# Altium footprint library DIOT_temperature_logger.PcbLib: 100 footprints (part 1 of 7)
Each footprint in its own frame and in the unit in brackets; x right, y up, seen from the top. Pads: shape width x height; smd on the part's side, far side on the other; paste and mask are expansions set on the pad; w line width, h text height; cw(c..) or ccw(c..) is an arc to the next point about the centre after c.
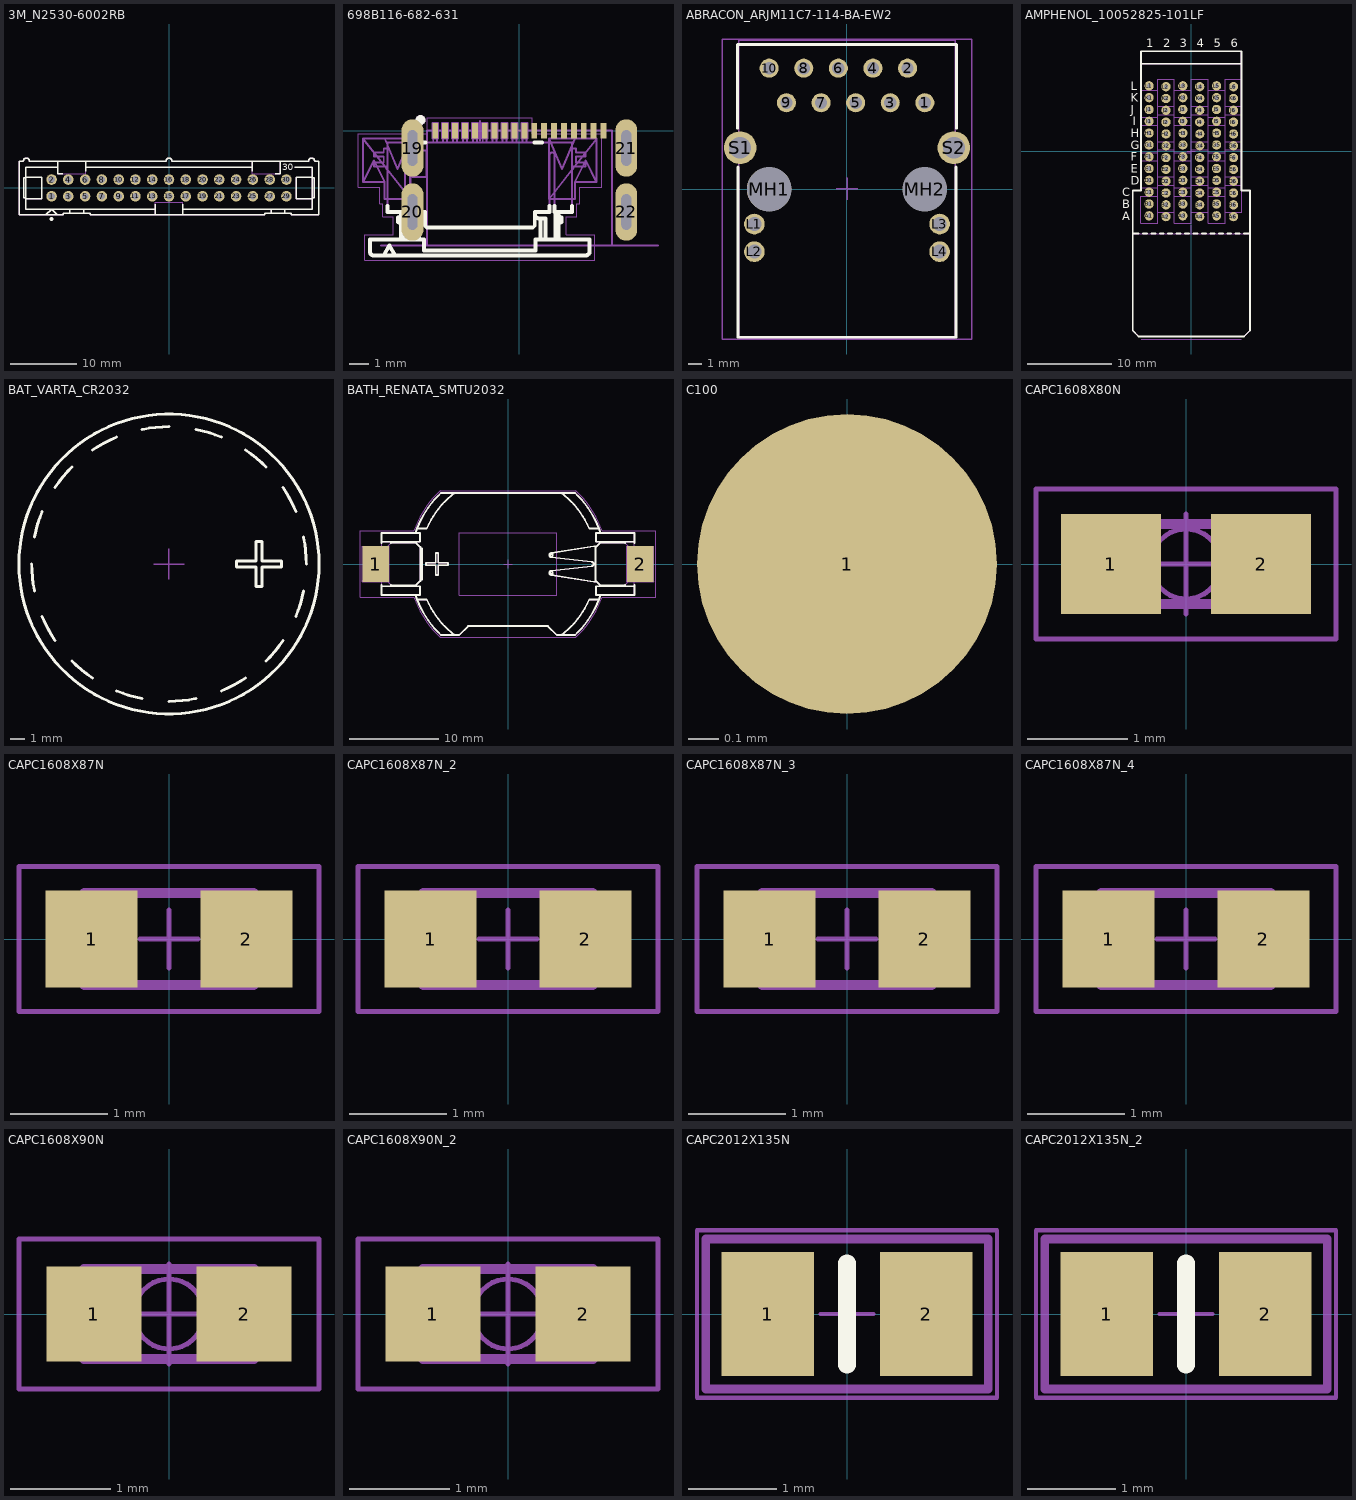
[diagram p0: the footprints below, top view; thin cyan lines are the x and y axes]

## 3M_N2530-6002RB [mm]
pads (30):
  round 1.6 hole 1: 1(-17.78,-1.27) 2(-17.78,1.27) 3(-15.24,-1.27) 4(-15.24,1.27) 5(-12.7,-1.27) 6(-12.7,1.27) 7(-10.16,-1.27) 8(-10.16,1.27) 9(-7.62,-1.27) 10(-7.62,1.27) 11(-5.08,-1.27) 12(-5.08,1.27) 13(-2.54,-1.27) 14(-2.54,1.27) 15(0,-1.27) 16(0,1.27) 17(2.54,-1.27) 18(2.54,1.27) 19(5.08,-1.27) 20(5.08,1.27) 21(7.62,-1.27) 22(7.62,1.27) 23(10.16,-1.27) 24(10.16,1.27) 25(12.7,-1.27) 26(12.7,1.27) 27(15.24,-1.27) 28(15.24,1.27) 29(17.78,-1.27) 30(17.78,1.27)
Top Overlay:
  circle w0.3: c-17.78,-4.699 r0.15
  lines w0.2: -21.692,-1.603 -19.279,-1.603 -19.279,1.603 -21.692,1.603 ; -21.692,-1.524 -21.996,-1.524 -21.996,1.524 -21.692,1.524 ; -18.644,-4.064 -17.78,-3.2 -16.916,-4.064 ; -16.828,3.15 -21.692,3.15 -21.692,-3.2 -2.096,-3.2 ; -16.828,4.064 -16.828,2.159 -16.119,2.159 ; -15.011,-3.835 -15.011,-3.2 ; -12.929,-3.835 -12.929,-3.2 ; -12.637,2.518 -12.637,4.064 ; -12.637,3.15 12.637,3.15 ; -2.096,-4.064 -2.096,-2.438 ; 2.095,-4.064 2.095,-2.438 ; 2.095,-3.2 21.692,-3.2 21.692,3.15 19.05,3.15 ; 12.637,2.518 12.637,4.064 ; 15.469,-3.835 15.469,-3.2 ; 16.119,2.159 16.828,2.159 16.828,4.064 ; 17.551,-3.835 17.551,-3.2 ; 21.692,-1.603 19.279,-1.603 19.279,1.603 21.692,1.603 ; 21.692,-1.524 21.996,-1.524 21.996,1.524 21.692,1.524 ; -22.708,-4.064 -16.002,-4.064 -16.002,-3.835 -11.938,-3.835 -11.938,-4.064 14.478,-4.064 14.478,-3.835 18.542,-3.835 18.542,-4.064 22.708,-4.064 22.708,4.064 22.047,4.064 ccw(c21.59,4.064) 21.133,4.064 0.457,4.064 ccw(c0,4.064) -0.457,4.064 -21.133,4.064 ccw(c-21.59,4.064) -22.047,4.064 -22.708,4.064 -22.708,-4.064
  text "30" at 17.145,2.667 h1.02
Mechanical 14:
  lines w0.1: -21.692,-1.603 -19.279,-1.603 -19.279,1.603 -21.692,1.603 ; -21.692,-1.524 -21.996,-1.524 -21.996,1.524 -21.692,1.524 ; -18.644,-4.064 -17.78,-3.2 -16.916,-4.064 ; -16.828,3.15 -21.692,3.15 -21.692,-3.2 -2.096,-3.2 ; -16.828,4.064 -16.828,2.159 -12.637,2.159 -12.637,4.064 ; -15.011,-3.835 -15.011,-3.2 ; -12.929,-3.835 -12.929,-3.2 ; -12.637,3.15 12.637,3.15 ; -2.096,-4.064 -2.096,-2.159 2.095,-2.159 2.095,-4.064 ; 2.095,-3.2 21.692,-3.2 21.692,3.15 19.05,3.15 ; 12.637,4.064 12.637,2.159 16.828,2.159 16.828,4.064 ; 15.469,-3.835 15.469,-3.2 ; 17.551,-3.835 17.551,-3.2 ; 21.692,-1.603 19.279,-1.603 19.279,1.603 21.692,1.603 ; 21.692,-1.524 21.996,-1.524 21.996,1.524 21.692,1.524 ; -22.708,-4.064 -16.002,-4.064 -16.002,-3.835 -11.938,-3.835 -11.938,-4.064 14.478,-4.064 14.478,-3.835 18.542,-3.835 18.542,-4.064 22.708,-4.064 22.708,4.064 22.047,4.064 ccw(c21.59,4.064) 21.133,4.064 0.457,4.064 ccw(c0,4.064) -0.457,4.064 -21.133,4.064 ccw(c-21.59,4.064) -22.047,4.064 -22.708,4.064 -22.708,-4.064
  text "30" at 17.145,2.667 h1.02
3D body "3M_N2530-6002RB.stp": height 9.91, standoff -2.84, extent -22.707,-4.115 22.708,4.521

## 698B116-682-631 [mm]
pads (22):
  rect 0.3x0.8 smd: 1(-4.25,0) 2(-3.75,0) 3(-3.25,0) 4(-2.75,0) 5(-2.24,0) 6(-1.75,0) 7(-1.25,0) 8(-0.75,0) 9(-0.25,0) 10(0.25,0) 11(0.75,0) 12(1.25,0) 13(1.75,0) 14(2.25,0) 15(2.75,0) 16(3.25,0) 17(3.75,0) 18(4.25,0)
  oval 1.1x2.9 hole 0.5 slot 1.8 at 90 deg: 19(-5.4,-0.875)
  oval 1.1x2.9 hole 0.5 slot 1.8 at 90 deg unplated: 20(-5.4,-4.105) 21(5.4,-0.875) 22(5.4,-4.105)
Top Overlay:
  circle w0.25: c-4.994,0.536 r0.125
  lines w0.2: -6.85,-6.3 -6.564,-5.8 -6.275,-6.3 ; -6.65,-3.8 -6.65,-4.1 -5.775,-4.1 -5.775,-3.8 ; -5.975,-5.5 -5.975,-4.1 ; -5.975,-4.7 -6.125,-4.613 -6.125,-4.387 -5.975,-4.3 ; -5.815,-5.5 -5.815,-4.1 ; -5.525,-3.8 -5.525,-4.1 -4.775,-4.1 -4.775,-4.8 -4.675,-4.9 0.675,-4.9 0.775,-4.8 0.775,-4.1 1.525,-4.1 1.525,-3.8 ; -5.325,-5.5 -5.325,-4.426 -5.075,-4.426 ; -5.15,-0.6 -4.75,-0.6 ; -5.075,-5.5 -5.075,-4.426 ; -4.775,-4.216 cw(c-4.985,-4.216) -4.985,-4.426 -5.075,-4.426 ; 0.75,-0.6 1.15,-0.6 ; 0.775,-4.216 ccw(c0.985,-4.216) 0.985,-4.426 1.325,-4.426 1.325,-5.5 ; 1.075,-5.5 1.075,-4.426 ; 1.775,-3.8 1.775,-4.1 2.65,-4.1 2.65,-3.8 ; 1.815,-5.5 1.815,-4.1 ; 1.975,-5.5 1.975,-4.1 ; 1.975,-4.7 2.125,-4.613 2.125,-4.387 1.975,-4.3 ; -7.55,-6.1 ccw(c-7.35,-6.1) -7.35,-6.3 3.35,-6.3 ccw(c3.35,-6.1) 3.55,-6.1 3.55,-5.5 0.825,-5.5 0.825,-6.05 -4.825,-6.05 -4.825,-5.5 -7.55,-5.5 -7.55,-6.1
Mechanical 1:
  lines w0.1: -7,-5.79 -4.675,-5.79 ; 7,-5.79 4.675,-5.79 ; -4.675,-5.79 -4.675,0 4.675,0 4.675,-5.79 ; -4.675,-5.79 4.675,-5.79
  text "Board edge" at -4.523,-5.384 h0.76
Mechanical 8:
  lines w0.1: -6.8,-0.4 -6.15,-1.925 -5.5,-0.4 ; -2.5,0 -2,0 ; -2,-0.5 -2,0 ; -2,0.5 -2,0 ; -1.5,0 -2,0 ; 2.8,-0.4 2.15,-1.925 1.5,-0.4 ; -7.9,-2.6 -7.35,-1.5 -6.8,-2.6 ; -7.9,-2.6 -7.9,-0.4 ; -7.9,-2.6 -6.8,-2.6 ; -7.9,-0.4 -6.7,-1.925 -5.5,-3.45 ; -7.9,-0.4 -5.5,-0.4 ; -6.8,-2.6 -6.8,-3.45 -5.5,-3.45 ; -5.5,-3.45 -5.5,-0.4 ; -4.4,0.4 -4.1,0.4 ; -4.4,0.4 -4.4,-0.4 -4.1,-0.4 -4.1,0.4 ; -4.4,0.4 -4.25,0 -4.1,0.4 ; -3.9,0.4 -3.6,0.4 ; -3.9,0.4 -3.9,-0.4 -3.6,-0.4 -3.6,0.4 ; -3.9,0.4 -3.75,0 -3.6,0.4 ; -3.4,0.4 -3.1,0.4 ; -3.4,0.4 -3.4,-0.4 -3.1,-0.4 -3.1,0.4 ; -3.4,0.4 -3.25,0 -3.1,0.4 ; -2.9,0.4 -2.6,0.4 ; -2.9,0.4 -2.9,-0.4 -2.6,-0.4 -2.6,0.4 ; -2.9,0.4 -2.75,0 -2.6,0.4 ; -2.4,0.4 -2.1,0.4 ; -2.4,0.4 -2.4,-0.4 -2.1,-0.4 -2.1,0.4 ; -2.4,0.4 -2.25,0 -2.1,0.4 ; -1.9,0.4 -1.6,0.4 ; -1.9,0.4 -1.9,-0.4 -1.6,-0.4 -1.6,0.4 ; -1.9,0.4 -1.75,0 -1.6,0.4 ; -1.4,0.4 -1.1,0.4 ; -1.4,0.4 -1.4,-0.4 -1.1,-0.4 -1.1,0.4 ; -1.4,0.4 -1.25,0 -1.1,0.4 ; -0.9,0.4 -0.6,0.4 ; -0.9,0.4 -0.9,-0.4 -0.6,-0.4 -0.6,0.4 ; -0.9,0.4 -0.75,0 -0.6,0.4 ; -0.4,0.4 -0.1,0.4 ; -0.4,0.4 -0.4,-0.4 -0.1,-0.4 -0.1,0.4 ; -0.4,0.4 -0.25,0 -0.1,0.4 ; 0.1,0.4 0.4,0.4 ; 0.1,0.4 0.1,-0.4 0.4,-0.4 0.4,0.4 ; 0.1,0.4 0.25,0 0.4,0.4 ; 1.5,-3.45 2.7,-1.925 3.9,-0.4 ; 1.5,-3.45 2.8,-3.45 2.8,-2.6 ; 1.5,-3.45 1.5,-0.4 ; 1.5,-0.4 3.9,-0.4 ; 2.8,-2.6 3.35,-1.5 3.9,-2.6 ; 2.8,-2.6 3.9,-2.6 ; 3.9,-2.6 3.9,-0.4 ; -5.4,-2.34 -4.7,-2.34 -4.7,-1 -5.4,-1 -5.4,-2.34
Mechanical 14:
  circle w0.25: c-4.994,0.536 r0.125
  lines w0.1: -6.85,-6.3 -6.564,-5.8 -6.275,-6.3 ; -6.65,-1.8 -7.35,-1.8 -7.35,-1.6 -6.85,-1.6 -6.85,-1.3 -7.35,-1.3 -7.35,-1.1 -6.85,-1.1 -6.85,-0.9 -6.65,-0.9 ; -5.975,-5.5 -5.975,-4.1 ; -5.975,-4.7 -6.125,-4.613 -6.125,-4.387 -5.975,-4.3 ; -5.815,-5.5 -5.815,-4.1 ; -5.325,-5.5 -5.325,-4.426 -5.075,-4.426 ; -5.075,-5.5 -5.075,-4.426 ; -4.775,-4.216 cw(c-4.985,-4.216) -4.985,-4.426 -5.075,-4.426 ; -4.35,-0.593 -4.35,0.1 -4.15,0.1 -4.15,-0.593 ; -3.85,-0.593 -3.85,0.1 -3.65,0.1 -3.65,-0.593 ; -3.35,-0.593 -3.35,0.1 -3.15,0.1 -3.15,-0.593 ; -2.85,-0.593 -2.85,0.1 -2.65,0.1 -2.65,-0.593 ; -2.35,-0.593 -2.35,0.1 -2.15,0.1 -2.15,-0.593 ; -1.85,-0.593 -1.85,0.1 -1.65,0.1 -1.65,-0.593 ; -1.35,-0.593 -1.35,0.1 -1.15,0.1 -1.15,-0.593 ; -0.85,-0.593 -0.85,0.1 -0.65,0.1 -0.65,-0.593 ; -0.35,-0.593 -0.35,0.1 -0.15,0.1 -0.15,-0.593 ; 0.15,-0.593 0.15,0.1 0.35,0.1 0.35,-0.593 ; 0.775,-4.216 ccw(c0.985,-4.216) 0.985,-4.426 1.325,-4.426 1.325,-5.5 ; 1.075,-5.5 1.075,-4.426 ; 1.815,-5.5 1.815,-4.1 ; 1.975,-5.5 1.975,-4.1 ; 1.975,-4.7 2.125,-4.613 2.125,-4.387 1.975,-4.3 ; 2.65,-1.8 3.35,-1.8 3.35,-1.6 2.85,-1.6 2.85,-1.3 3.35,-1.3 3.35,-1.1 2.85,-1.1 2.85,-0.9 2.65,-0.9 ; -7.55,-6.1 ccw(c-7.35,-6.1) -7.35,-6.3 3.35,-6.3 ccw(c3.35,-6.1) 3.55,-6.1 3.55,-5.5 0.825,-5.5 0.825,-6.05 -4.825,-6.05 -4.825,-5.5 -7.55,-5.5 -7.55,-6.1 ; -6.65,-4.1 -6.65,-0.6 2.65,-0.6 2.65,-4.1 1.775,-4.1 1.775,-1.225 ccw(c1.65,-1.225) 1.525,-1.225 1.525,-4.1 0.775,-4.1 0.775,-4.8 0.675,-4.9 -4.675,-4.9 -4.775,-4.8 -4.775,-4.1 -5.525,-4.1 -5.525,-1.225 ccw(c-5.65,-1.225) -5.775,-1.225 -5.775,-4.1 -6.65,-4.1
Mechanical 15:
  lines w0.05: -8.15,-2.85 -8.15,-0.15 -4.65,-0.15 -4.65,0.65 0.65,0.65 0.65,-0.15 4.15,-0.15 4.15,-2.85 3.05,-2.85 3.05,-3.7 2.9,-3.7 2.9,-4.35 2.375,-4.35 2.375,-5.25 3.8,-5.25 3.8,-6.55 -7.8,-6.55 -7.8,-5.25 -6.375,-5.25 -6.375,-4.35 -6.9,-4.35 -6.9,-3.7 -7.05,-3.7 -7.05,-2.85 -8.15,-2.85
3D body "698B116-682-631 - EDAC USB Connector.STEP": height 1.61, standoff -1.36, extent -5.5,-6.55 5.5,0

## ABRACON_ARJM11C7-114-BA-EW2 [mm]
pads (18):
  round 1.4 hole 0.9: 1(5.715,6.35) 2(4.445,8.89) 3(3.175,6.35) 4(1.905,8.89) 5(0.635,6.35) 6(-0.635,8.89) 7(-1.905,6.35) 8(-3.175,8.89) 9(-4.445,6.35) 10(-5.715,8.89)
  round 1.52 hole 1.02: L1(-6.8,-2.55) L2(-6.8,-4.58) L3(6.8,-2.55) L4(6.8,-4.58)
  round 3.25 hole 3.25 unplated: MH1(-5.715,0)
  round 3.2 hole 3.25 unplated: MH2(5.715,0)
  round 2.4 hole 1.6: S1(-7.845,3.05) S2(7.845,3.05)
Top Overlay:
  lines w0.2: -8.04,4.47 -8.04,10.63 8.04,10.63 8.04,4.47 ; -8,1.63 -8,-10.87 8,-10.87 8,1.63
Mechanical 11:
  lines w0.1: -7.94,-10.89 -7.94,10.95 7.94,10.95 7.94,-10.89 -7.94,-10.89
  text ".Designator" at 0,0.03 h1
Mechanical 13:
  lines w0.1: -7.94,-10.89 7.94,-10.89 7.94,10.63 -7.94,10.63 -7.94,-10.89
Mechanical 15:
  lines w0.1: -0.8,0.03 0.8,0.03 ; 0,-0.77 0,0.83 ; -9.145,-10.989 9.145,-10.989 9.145,11.03 -9.145,11.03 -9.145,-10.989
3D body "ARJ11C-MBSAT-A-B-3MU2.STEP": height 16.15, standoff -3.29, extent -10.327,-10.871 10.328,10.63

## AMPHENOL_10052825-101LF [mm]
pads (72):
  round 1.1 hole 0.5: A1(-5,-7.65) A2(-3,-7.75) A3(-1,-7.65) A4(1,-7.75) A5(3,-7.65) A6(5,-7.75) B1(-5,-6.25) B2(-3,-6.35) B3(-1,-6.25) B4(1,-6.35) B5(3,-6.25) B6(5,-6.35) C1(-5,-4.85) C2(-3,-4.95) C3(-1,-4.85) C4(1,-4.95) C5(3,-4.85) C6(5,-4.95) D1(-5,-3.45) D2(-3,-3.55) D3(-1,-3.45) D4(1,-3.55) D5(3,-3.45) D6(5,-3.55) E1(-5,-2.05) E2(-3,-2.15) E3(-1,-2.05) E4(1,-2.15) E5(3,-2.05) E6(5,-2.15) F1(-5,-0.65) F2(-3,-0.75) F3(-1,-0.65) F4(1,-0.75) F5(3,-0.65) F6(5,-0.75) G1(-5,0.75) G2(-3,0.65) G3(-1,0.75) G4(1,0.65) G5(3,0.75) G6(5,0.65) H1(-5,2.15) H2(-3,2.05) H3(-1,2.15) H4(1,2.05) H5(3,2.15) H6(5,2.05) I1(-5,3.55) I2(-3,3.45) I3(-1,3.55) I4(1,3.45) I5(3,3.55) I6(5,3.45) J1(-5,4.95) J2(-3,4.85) J3(-1,4.95) J4(1,4.85) J5(3,4.95) J6(5,4.85) K1(-5,6.35) K2(-3,6.25) K3(-1,6.35) K4(1,6.25) K5(3,6.35) K6(5,6.25) L1(-5,7.75) L2(-3,7.65) L3(-1,7.75) L4(1,7.65) L5(3,7.75) L6(5,7.65)
Top Overlay:
  lines w0.2: -6.95,-9.75 -6.25,-9.75 ; -5.95,10.35 5.95,10.35 ; -5.75,-9.75 -5.25,-9.75 ; -4.75,-9.75 -4.25,-9.75 ; -3.75,-9.75 -3.25,-9.75 ; -2.75,-9.75 -2.25,-9.75 ; -1.75,-9.75 -1.25,-9.75 ; -0.75,-9.75 -0.25,-9.75 ; 0.25,-9.75 0.75,-9.75 ; 1.25,-9.75 1.75,-9.75 ; 2.25,-9.75 2.75,-9.75 ; 3.25,-9.75 3.75,-9.75 ; 4.25,-9.75 4.75,-9.75 ; 5.25,-9.75 5.75,-9.75 ; 6.25,-9.75 6.95,-9.75 ; -6.95,-21.25 -6.25,-21.95 6.25,-21.95 6.95,-21.25 6.95,-4.65 5.95,-4.65 5.95,11.85 -5.95,11.85 -5.95,-4.65 -6.95,-4.65 -6.95,-21.25
  text "6" at 4.65,12.3 h1
  text "5" at 2.65,12.3 h1
  text "4" at 0.65,12.3 h1
  text "3" at -1.35,12.3 h1
  text "2" at -3.35,12.3 h1
  text "1" at -5.35,12.3 h1
  text "L" at -7.2,7.25 h1
  text "K" at -7.2,5.85 h1
  text "J" at -7.2,4.45 h1
  text "I" at -6.95,3.05 h1
  text "H" at -7.2,1.65 h1
  text "G" at -7.2,0.25 h1
  text "F" at -7.2,-1.15 h1
  text "E" at -7.2,-2.55 h1
  text "D" at -7.2,-3.95 h1
  text "C" at -8.2,-5.35 h1
  text "B" at -8.2,-6.75 h1
  text "A" at -8.2,-8.15 h1
Mechanical 8:
  drawing of 248 lines, arcs and shapes, not listed
  text "Edge of Daugher Card" at -3.225,-10.5 h0.5
  text "Top Surface of Mother Board" at -4.375,-22 h0.5
Mechanical 14:
  lines w0.1: -6.95,-9.75 -6.25,-9.75 ; -5.95,10.35 5.95,10.35 ; -5.75,-9.75 -5.25,-9.75 ; -4.75,-9.75 -4.25,-9.75 ; -3.75,-9.75 -3.25,-9.75 ; -2.75,-9.75 -2.25,-9.75 ; -1.75,-9.75 -1.25,-9.75 ; -0.75,-9.75 -0.25,-9.75 ; 0.25,-9.75 0.75,-9.75 ; 1.25,-9.75 1.75,-9.75 ; 2.25,-9.75 2.75,-9.75 ; 3.25,-9.75 3.75,-9.75 ; 4.25,-9.75 4.75,-9.75 ; 5.25,-9.75 5.75,-9.75 ; 6.25,-9.75 6.95,-9.75 ; -6.95,-21.25 -6.25,-21.95 6.25,-21.95 6.95,-21.25 6.95,-4.65 5.95,-4.65 5.95,11.85 -5.95,11.85 -5.95,-4.65 -6.95,-4.65 -6.95,-21.25
  text "6" at 4.65,12.3 h1
  text "5" at 2.65,12.3 h1
  text "4" at 0.65,12.3 h1
  text "3" at -1.35,12.3 h1
  text "2" at -3.35,12.3 h1
  text "1" at -5.35,12.3 h1
  text "L" at -7.2,7.25 h1
  text "K" at -7.2,5.85 h1
  text "J" at -7.2,4.45 h1
  text "I" at -6.95,3.05 h1
  text "H" at -7.2,1.65 h1
  text "G" at -7.2,0.25 h1
  text "F" at -7.2,-1.15 h1
  text "E" at -7.2,-2.55 h1
  text "D" at -7.2,-3.95 h1
  text "C" at -8.2,-5.35 h1
  text "B" at -8.2,-6.75 h1
  text "A" at -8.2,-8.15 h1
Drill Drawing:
  lines w0.1: -6,-8.75 -6,8.75 6,8.75 6,-8.75 -6,-8.75
  text "Diam. 0.5mm +/-0.05" at 9,-8.4 h1
  text "PRESS-FIT TECHNOLOGY" at 7.5,-8.4 h1
3D body "AMPHENOL_10052825-101LF.stp": height 15.25, standoff -4.45, extent -6.95,-21.95 6.95,11.85

## BAT_VARTA_CR2032 [mm]
Top Overlay:
  circle w0.2: c-100.1,-152.4 r10
  lines w0.2: -109.25,-152.4 ccw(c-100.1,-152.4) -109.074,-154.185 ; -109.074,-150.615 cw(c-100.1,-152.4) -108.554,-148.898 ; -108.554,-155.902 ccw(c-100.1,-152.4) -107.708,-157.483 ; -107.708,-147.317 cw(c-100.1,-152.4) -106.57,-145.93 ; -106.57,-158.87 ccw(c-100.1,-152.4) -105.183,-160.008 ; -105.183,-144.792 cw(c-100.1,-152.4) -103.602,-143.946 ; -103.602,-160.854 ccw(c-100.1,-152.4) -101.885,-161.374 ; -101.885,-143.426 cw(c-100.1,-152.4) -100.1,-143.25 ; -100.1,-161.55 ccw(c-100.1,-152.4) -98.315,-161.374 ; -98.315,-143.426 cw(c-100.1,-152.4) -96.598,-143.946 ; -96.598,-160.854 ccw(c-100.1,-152.4) -95.017,-160.008 ; -95.017,-144.792 cw(c-100.1,-152.4) -93.63,-145.93 ; -93.63,-158.87 ccw(c-100.1,-152.4) -92.492,-157.483 ; -92.492,-147.317 cw(c-100.1,-152.4) -91.646,-148.898 ; -91.646,-155.902 ccw(c-100.1,-152.4) -91.126,-154.185 ; -91.126,-150.615 cw(c-100.1,-152.4) -90.95,-152.4 ; -95.6,-152.6 -95.6,-152.2 -94.287,-152.2 -94.287,-150.9 -93.887,-150.9 -93.887,-152.2 -92.6,-152.2 -92.6,-152.6 -93.887,-152.6 -93.887,-153.9 -94.287,-153.9 -94.287,-152.6 -95.6,-152.6
Mechanical 8:
  lines w0.1: -101.1,-152.4 -100.1,-152.4 ; -100.1,-153.4 -100.1,-152.4 ; -100.1,-151.4 -100.1,-152.4 ; -99.1,-152.4 -100.1,-152.4
Mechanical 13:
  circle w0.1: c-100.1,-152.4 r10
Mechanical 14:
  lines w0.1: -109.25,-152.4 ccw(c-100.1,-152.4) -109.074,-154.185 ; -109.074,-150.615 cw(c-100.1,-152.4) -108.554,-148.898 ; -108.554,-155.902 ccw(c-100.1,-152.4) -107.708,-157.483 ; -107.708,-147.317 cw(c-100.1,-152.4) -106.57,-145.93 ; -106.57,-158.87 ccw(c-100.1,-152.4) -105.183,-160.008 ; -105.183,-144.792 cw(c-100.1,-152.4) -103.602,-143.946 ; -103.602,-160.854 ccw(c-100.1,-152.4) -101.885,-161.374 ; -101.885,-143.426 cw(c-100.1,-152.4) -100.1,-143.25 ; -100.1,-161.55 ccw(c-100.1,-152.4) -98.315,-161.374 ; -98.315,-143.426 cw(c-100.1,-152.4) -96.598,-143.946 ; -96.598,-160.854 ccw(c-100.1,-152.4) -95.017,-160.008 ; -95.017,-144.792 cw(c-100.1,-152.4) -93.63,-145.93 ; -93.63,-158.87 ccw(c-100.1,-152.4) -92.492,-157.483 ; -92.492,-147.317 cw(c-100.1,-152.4) -91.646,-148.898 ; -91.646,-155.902 ccw(c-100.1,-152.4) -91.126,-154.185 ; -91.126,-150.615 cw(c-100.1,-152.4) -90.95,-152.4 ; -95.6,-152.6 -95.6,-152.2 -94.287,-152.2 -94.287,-150.9 -93.887,-150.9 -93.887,-152.2 -92.6,-152.2 -92.6,-152.6 -93.887,-152.6 -93.887,-153.9 -94.287,-153.9 -94.287,-152.6 -95.6,-152.6
3D body "BAT_VARTA_CR2032.stp": height 3.2, standoff 0, extent -110.1,-162.4 -90.1,-142.4

## BATH_RENATA_SMTU2032 [mm]
pads (2):
  rect 3x4 smd: 1(-14.9,0) 2(14.9,0)
Top Overlay:
  circle w0.2: c4.9,1 r0.15
  circle w0.2: c4.9,-1 r0.15
  lines w0.2: -14.25,-2.5 -9.928,-2.5 -9.928,-3.5 -14.25,-3.5 -14.25,-2.35 ; -14.25,2.35 -14.25,3.5 -9.928,3.5 -9.928,2.5 -14.25,2.5 ; -13.222,-2.35 -13.172,-2.4 -10.372,-2.4 -9.872,-1.9 -9.872,1.9 -10.372,2.4 -13.172,2.4 -13.222,2.35 ; -10.428,-3.5 ccw(c0,0) -7.55,-8 -5.5,-8 -4.5,-7 4.5,-7 5.5,-8 7.55,-8 ccw(c0,0) 10.428,-3.5 ; -10.428,3.5 cw(c0,0) -7.55,8 7.55,8 cw(c0,0) 10.428,3.5 ; -10.247,-4 -9.165,-4 ccw(c0,0) -6,-8 ; -10.247,4 -9.165,4 cw(c0,0) -6,8 ; -9.872,-1.75 -9.65,-1.75 -9.65,1.75 -9.872,1.75 ; 6,-8 ccw(c0,0) 9.165,-4 10.247,-4 ; 6,8 cw(c0,0) 9.165,4 10.247,4 ; 9.9,-1.928 9.9,-2 9.65,-2 4.861,-1.247 cw(c4.9,-1) 4.873,-0.752 9.435,-0.248 ccw(c9.4,0) 9.435,0.248 4.873,0.752 cw(c4.9,1) 4.861,1.247 9.65,2 9.9,2 9.9,1.928 ; 13.222,-2.35 13.172,-2.4 10.372,-2.4 9.872,-1.9 9.872,1.9 10.372,2.4 13.172,2.4 13.222,2.35 ; 14.25,-2.5 9.928,-2.5 9.928,-3.5 14.25,-3.5 14.25,-2.35 ; 14.25,2.35 14.25,3.5 9.928,3.5 9.928,2.5 14.25,2.5 ; -9.25,-0.15 -8.15,-0.15 -8.15,-1.25 -7.85,-1.25 -7.85,-0.15 -6.75,-0.15 -6.75,0.15 -7.85,0.15 -7.85,1.25 -8.15,1.25 -8.15,0.15 -9.25,0.15 -9.25,-0.15
Mechanical 8:
  lines w0.05: -0.5,0 0,0 ; 0,-0.5 0,0 ; 0,0.5 0,0 ; 0.5,0 0,0 ; -16.4,-2 -16.4,2 ; -16.4,-2 -13.4,-2 -13.4,2 -16.4,2 ; -16.4,-2 -14.9,0 -16.4,2 ; 16.4,-2 13.4,-2 13.4,2 16.4,2 ; 16.4,-2 16.4,2 ; 16.4,-2 14.9,0 16.4,2 ; -5.5,-3.5 5.5,-3.5 5.5,3.5 -5.5,3.5 -5.5,-3.5
Mechanical 14:
  circle w0.1: c4.9,1 r0.15
  circle w0.1: c4.9,-1 r0.15
  lines w0.1: -14.25,-2.5 -9.928,-2.5 -9.928,-3.5 -14.25,-3.5 -14.25,-1.75 ; -14.25,1.75 -14.25,3.5 -9.928,3.5 -9.928,2.5 -14.25,2.5 ; -13.672,-1.75 -16,-1.75 -16,1.75 -13.672,1.75 ; -10.428,-3.5 ccw(c0,0) -7.55,-8 -5.5,-8 -4.5,-7 4.5,-7 5.5,-8 7.55,-8 ccw(c0,0) 10.428,-3.5 ; -10.428,3.5 cw(c0,0) -7.55,8 7.55,8 cw(c0,0) 10.428,3.5 ; -10.247,-4 -9.165,-4 ccw(c0,0) -6,-8 ; -10.247,4 -9.165,4 cw(c0,0) -6,8 ; -9.872,-1.75 -9.65,-1.75 -9.65,1.75 -9.872,1.75 ; 6,-8 ccw(c0,0) 9.165,-4 10.247,-4 ; 6,8 cw(c0,0) 9.165,4 10.247,4 ; 9.9,-1.928 9.9,-2 9.65,-2 4.861,-1.247 cw(c4.9,-1) 4.873,-0.752 9.435,-0.248 ccw(c9.4,0) 9.435,0.248 4.873,0.752 cw(c4.9,1) 4.861,1.247 9.65,2 9.9,2 9.9,1.928 ; 13.672,-1.75 16,-1.75 16,1.75 13.672,1.75 ; 14.25,-2.5 9.928,-2.5 9.928,-3.5 14.25,-3.5 14.25,-1.75 ; 14.25,1.75 14.25,3.5 9.928,3.5 9.928,2.5 14.25,2.5 ; -13.672,-1.9 -13.672,1.9 -13.172,2.4 -10.372,2.4 -9.872,1.9 -9.872,-1.9 -10.372,-2.4 -13.172,-2.4 -13.672,-1.9 ; -9.25,-0.15 -8.15,-0.15 -8.15,-1.25 -7.85,-1.25 -7.85,-0.15 -6.75,-0.15 -6.75,0.15 -7.85,0.15 -7.85,1.25 -8.15,1.25 -8.15,0.15 -9.25,0.15 -9.25,-0.15 ; 9.872,-1.9 10.372,-2.4 13.172,-2.4 13.672,-1.9 13.672,1.9 13.172,2.4 10.372,2.4 9.872,1.9 9.872,-1.9
Mechanical 15:
  lines w0.05: -16.65,-3.75 -16.65,3.75 -10.607,3.75 cw(c0,0) -7.649,8.25 7.649,8.25 cw(c0,0) 10.607,3.75 16.65,3.75 16.65,-3.75 10.607,-3.75 cw(c0,0) 7.649,-8.25 -7.649,-8.25 cw(c0,0) -10.607,-3.75 -16.65,-3.75
3D body "BATH_RENATA_SMTU2032.stp": height 5.6, standoff 0, extent -16,-8 16,8

## C100 [mm]
pads (1):
  round 1 smd paste-1: 1(0,0)

## CAPC1608X80N [mm]
pads (2):
  rect 1x1 smd: 1(-0.75,0) 2(0.75,0)
Mechanical 14:
  lines w0.1: -0.8,-0.4 -0.8,0.4 0.8,0.4 0.8,-0.4 -0.8,-0.4
Mechanical 15:
  circle w0.05: c0,0 r0.35
  lines w0.05: -0.5,0 0.5,0 ; 0,-0.5 0,0.5 ; -1.5,-0.75 -1.5,0.75 1.5,0.75 1.5,-0.75 -1.5,-0.75
3D body "CAPC1608X80N.stp": height 0.8, standoff 0, extent -0.875,-0.475 0.875,0.475

## CAPC1608X87N [mm]
pads (2):
  rect 0.95x1 smd: 1(-0.8,0) 2(0.8,0)
Mechanical 14:
  lines w0.1: -0.875,-0.475 -0.875,0.475 0.875,0.475 0.875,-0.475 -0.875,-0.475
Mechanical 15:
  lines w0.05: -0.3,0 0.3,0 ; 0,-0.3 0,0.3 ; -1.55,-0.75 1.55,-0.75 1.55,0.75 -1.55,0.75 -1.55,-0.75
3D body "CAPC1608X87N.stp": height 0.87, standoff 0, extent -0.875,-0.475 0.875,0.475

## CAPC1608X87N_2 [mm]
pads (2):
  rect 0.95x1 smd: 1(-0.8,0) 2(0.8,0)
Mechanical 14:
  lines w0.1: -0.875,-0.475 -0.875,0.475 0.875,0.475 0.875,-0.475 -0.875,-0.475
Mechanical 15:
  lines w0.05: -0.3,0 0.3,0 ; 0,-0.3 0,0.3 ; -1.55,-0.75 1.55,-0.75 1.55,0.75 -1.55,0.75 -1.55,-0.75
3D body "CAPC1608X87N.stp": height 0.87, standoff 0, extent -0.875,-0.475 0.875,0.475

## CAPC1608X87N_3 [mm]
pads (2):
  rect 0.95x1 smd: 1(-0.8,0) 2(0.8,0)
Mechanical 14:
  lines w0.1: -0.875,-0.475 0.875,-0.475 0.875,0.475 -0.875,0.475 -0.875,-0.475
Mechanical 15:
  lines w0.05: -0.3,0 0.3,0 ; 0,-0.3 0,0.3 ; -1.55,-0.75 -1.55,0.75 1.55,0.75 1.55,-0.75 -1.55,-0.75
3D body "CAPC1608X87N.stp": height 0.87, standoff 0, extent -0.875,-0.475 0.875,0.475

## CAPC1608X87N_4 [mm]
pads (2):
  rect 0.95x1 smd: 1(-0.8,0) 2(0.8,0)
Mechanical 14:
  lines w0.1: -0.875,-0.475 -0.875,0.475 0.875,0.475 0.875,-0.475 -0.875,-0.475
Mechanical 15:
  lines w0.05: -0.3,0 0.3,0 ; 0,-0.3 0,0.3 ; -1.55,-0.75 1.55,-0.75 1.55,0.75 -1.55,0.75 -1.55,-0.75
3D body "CAPC1608X87N.stp": height 0.87, standoff 0, extent -0.875,-0.475 0.875,0.475

## CAPC1608X90N [mm]
pads (2):
  rect 0.95x0.95 smd: 1(-0.75,0) 2(0.75,0)
Mechanical 14:
  lines w0.1: -0.85,-0.45 0.85,-0.45 0.85,0.45 -0.85,0.45 -0.85,-0.45
Mechanical 15:
  circle w0.05: c0,0 r0.35
  lines w0.05: -0.5,0 0.5,0 ; 0,-0.5 0,0.5 ; -1.5,-0.75 1.5,-0.75 1.5,0.75 -1.5,0.75 -1.5,-0.75
3D body "CAPC1608X90N.stp": height 0.9, standoff 0, extent -0.85,-0.45 0.85,0.45

## CAPC1608X90N_2 [mm]
pads (2):
  rect 0.95x0.95 smd: 1(-0.75,0) 2(0.75,0)
Mechanical 14:
  lines w0.1: -0.85,-0.45 -0.85,0.45 0.85,0.45 0.85,-0.45 -0.85,-0.45
Mechanical 15:
  circle w0.05: c0,0 r0.35
  lines w0.05: -0.5,0 0.5,0 ; 0,-0.5 0,0.5 ; -1.5,-0.75 -1.5,0.75 1.5,0.75 1.5,-0.75 -1.5,-0.75
3D body "CAPC1608X90N.stp": height 0.9, standoff 0, extent -0.85,-0.45 0.85,0.45

## CAPC2012X135N [mm]
pads (2):
  rect 1.05x1.4 smd: 1(-0.9,0) 2(0.9,0)
Top Overlay:
  lines w0.2: 0,-0.575 0,0.575
Mechanical 14:
  lines w0.1: -1.6,-0.85 1.6,-0.85 1.6,0.85 -1.6,0.85 -1.6,-0.85
Mechanical 15:
  lines w0.05: -0.3,0 0.3,0 ; 0,-0.3 0,0.3 ; -1.7,-0.95 1.7,-0.95 1.7,0.95 -1.7,0.95 -1.7,-0.95
3D body "CAPC2012X135N.stp": height 1.25, standoff 0, extent -1.05,-0.675 1.05,0.675

## CAPC2012X135N_2 [mm]
pads (2):
  rect 1.05x1.4 smd: 1(-0.9,0) 2(0.9,0)
Top Overlay:
  lines w0.2: 0,-0.575 0,0.575
Mechanical 14:
  lines w0.1: -1.6,-0.85 1.6,-0.85 1.6,0.85 -1.6,0.85 -1.6,-0.85
Mechanical 15:
  lines w0.05: -0.3,0 0.3,0 ; 0,-0.3 0,0.3 ; -1.7,-0.95 1.7,-0.95 1.7,0.95 -1.7,0.95 -1.7,-0.95
3D body "CAPC2012X135N.stp": height 1.25, standoff 0, extent -1.05,-0.675 1.05,0.675